# Altium footprint library Burn Wire Dev Board.PcbLib: 40 footprints (part 1 of 3)
Each footprint in its own frame and in the unit in brackets; x right, y up, seen from the top. Pads: shape width x height; smd on the part's side, far side on the other; paste and mask are expansions set on the pad; w line width, h text height; cw(c..) or ccw(c..) is an arc to the next point about the centre after c.
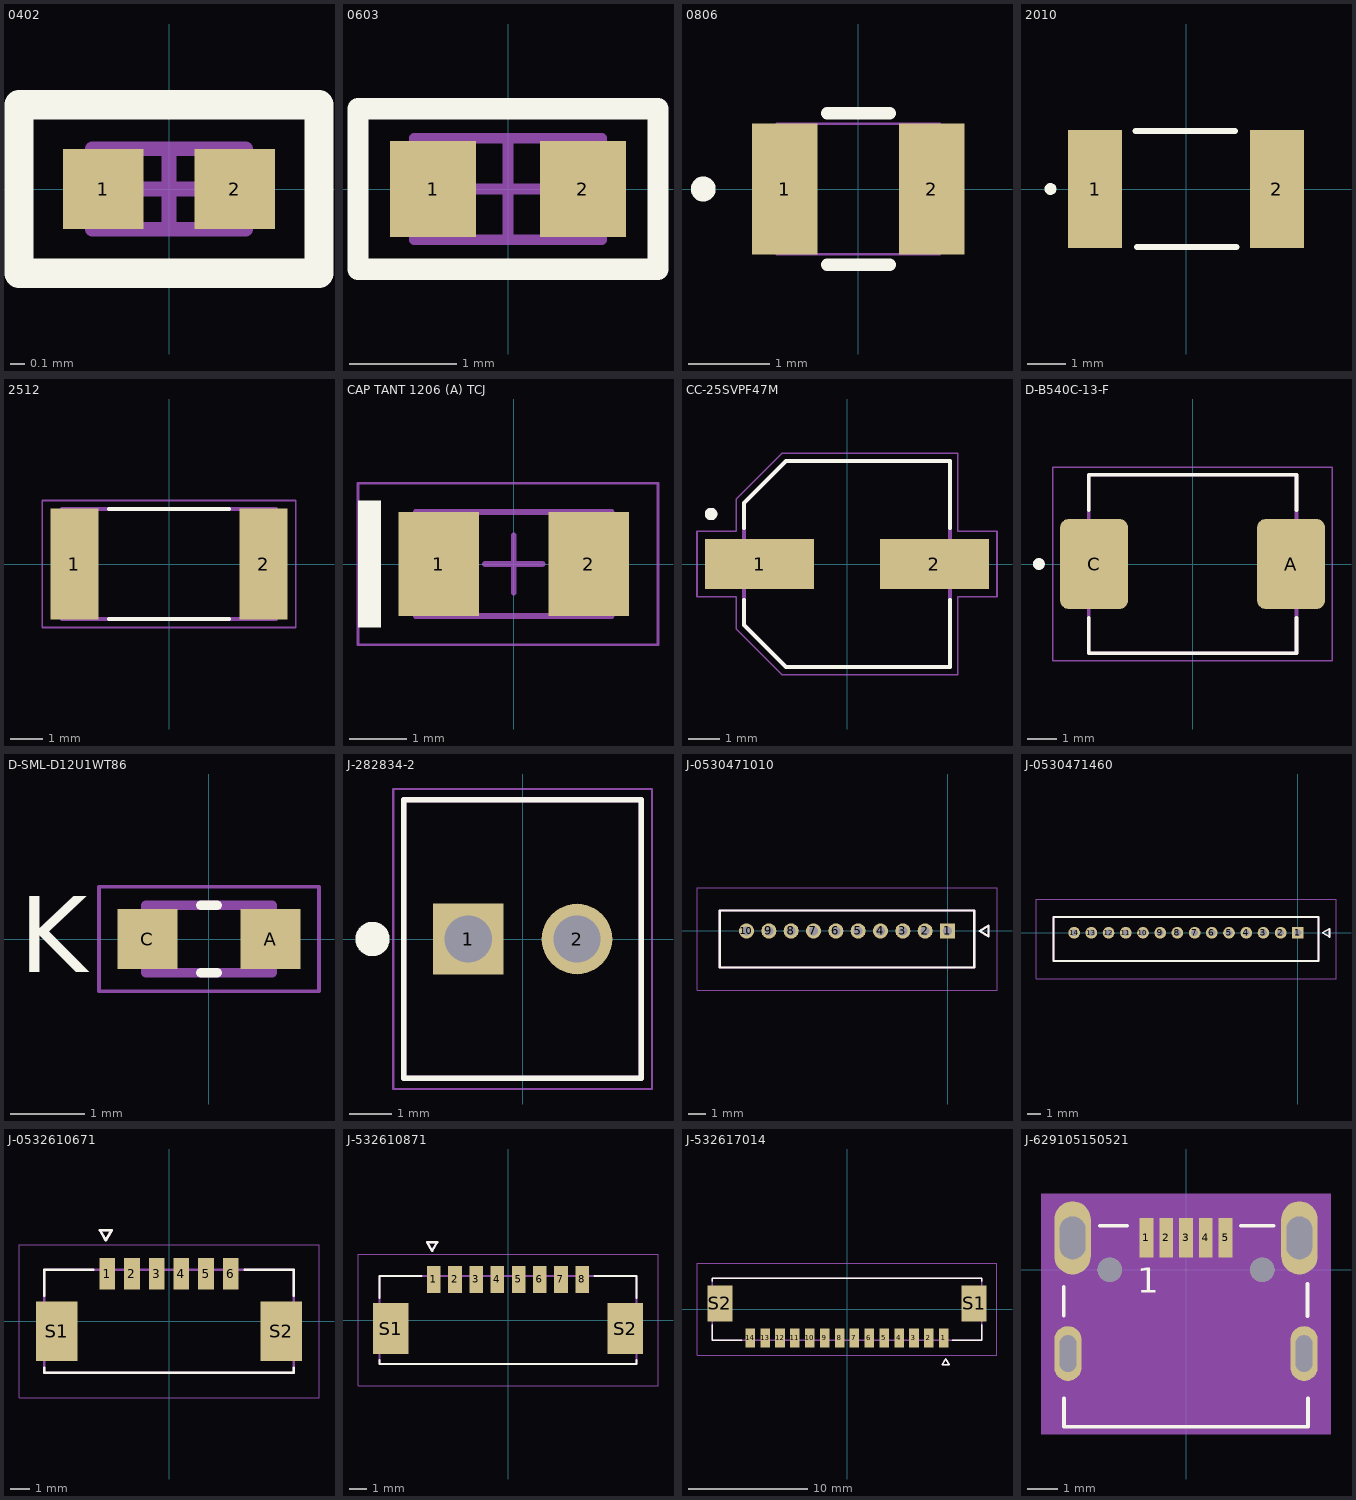
[diagram p0: the footprints below, top view; thin cyan lines are the x and y axes]

## 0402 [mm] "Chip Resistor, 2-Leads, Body 1,00x0,50mm, IPC Medium Density"
height 0.4
pads (2):
  rect 0.55x0.55 smd: 1(-0.45,0) 2(0.45,0)
Top Overlay:
  lines w0.2: -1.025,-0.575 1.025,-0.575 1.025,0.575 -1.025,0.575 -1.025,-0.575
Mechanical 13:
  lines w0.1: -0.525,-0.275 -0.525,0.275 0.525,0.275 0.525,-0.275 -0.525,-0.275
  text ".Designator" at 0,0 h1
Mechanical 15:
  lines w0.05: -1.025,-0.575 -1.025,0.575 1.025,0.575 1.025,-0.575 -1.025,-0.575
  lines w0.1: -0.275,0 0.275,0 ; 0,-0.275 0,0.275
3D body: height 0.4, standoff 0, extent -0.275,-0.275 0.275,0.275
3D body: height 0.4, standoff 0, extent -0.525,-0.275 -0.275,0.275
3D body: height 0.4, standoff 0, extent 0.275,-0.275 0.525,0.275

## 0603 [mm]
pads (2):
  rect 0.8x0.9 smd: 1(-0.7,0) 2(0.7,0)
Top Overlay:
  lines w0.2: -1.4,-0.75 -1.4,0.75 1.4,0.75 1.4,-0.75 -1.4,-0.75
Mechanical 13:
  lines w0.1: -0.875,-0.475 -0.875,0.475 0.875,0.475 0.875,-0.475 -0.875,-0.475
  text ".Designator" at 0,0 h1
Mechanical 15:
  lines w0.1: -0.475,0 0.475,0 ; 0,-0.475 0,0.475 ; -1.4,-0.75 1.4,-0.75 1.4,0.75 -1.4,0.75 -1.4,-0.75
3D body: height 1.3, standoff 0, extent -0.875,-0.475 0.875,0.475

## 0806 [mm]
pads (2):
  rect 0.8x1.6 smd paste+0 mask+0: 1(-0.9,0) 2(0.9,0)
Top Overlay:
  circle w0.152: c-1.9,0 r0.076
  lines w0.152: -0.383,-0.927 0.383,-0.927 ; -0.383,0.927 0.383,0.927
Mechanical 13:
  circle w0: c-1.002,0 r0.076
  lines w0.025: -1,-0.8 -1,0.8 ; -1,-0.8 -0.7,-0.8 -0.7,0.8 -1,0.8 ; -1,-0.8 1,-0.8 ; -1,-0.8 -1,0.8 ; -1,0.8 1,0.8 ; 1,-0.8 0.7,-0.8 0.7,0.8 1,0.8 ; 1,-0.8 1,0.8 ; 1,-0.8 1,0.8
3D body "IND_2016_TDK.step": height 0.85, standoff 0, extent -1,-0.8 1,0.8

## 2010 [mm]
pads (2):
  rect 1.4x3.05 smd paste+0 mask+0: 1(-2.35,0) 2(2.35,0)
Top Overlay:
  circle w0.152: c-3.5,0 r0.076
  lines w0.152: -1.3,1.5 1.266,1.5 ; -1.266,-1.5 1.3,-1.5
3D body "CRGP2010F22R.STEP": height 0.65, standoff 0, extent -2.5,-1.25 2.5,1.25

## 2512 [mm]
pads (2):
  rect 1.49x3.42 smd: 1(-2.914,0) 2(2.914,0)
Top Overlay:
  lines w0.127: -1.85,-1.7 1.85,-1.7 ; -1.85,1.7 1.85,1.7
Mechanical 13:
  lines w0.127: -3.3,-1.7 3.3,-1.7 3.3,1.7 -3.3,1.7 -3.3,-1.7
Mechanical 15:
  lines w0.05: -3.908,-1.958 3.908,-1.958 3.908,1.958 -3.908,1.958 -3.908,-1.958
3D body "CRA2512-FZ-R100ELF.STEP": height 0.9, standoff 0, extent -3.2,-1.6 3.2,1.6

## CAP TANT 1206 (A) TCJ [mm] "Cap Tant 2-Leads, EIA 1206, Metric 3216, Body 3.2x1.6mm"
height 1.8
pads (2):
  rect 1.4x1.8 smd: 1(-1.3,0) 2(1.3,0)
Top Overlay:
  rectangle: -2.7,-1.1 -2.3,1.1
Mechanical 13:
  lines w0.1: -1.7,-0.9 -1.7,0.9 1.7,0.9 1.7,-0.9 -1.7,-0.9
  text ".Designator" at 0,0 h1
Mechanical 15:
  lines w0.05: -2.7,-1.4 -2.7,1.4 2.5,1.4 2.5,-1.4 -2.7,-1.4
  lines w0.1: -0.5,0 0.5,0 ; 0,-0.5 0,0.5
3D body "TCJA106M016R0200E-TCJ_A-AVX-TAN.stp": height 1.72, standoff 0.01, extent -1.7,-0.84 1.7,0.84

## CC-25SVPF47M [mm]
pads (2):
  rect 3.5x1.6 smd: 1(-2.8,0) 2(2.8,0)
Top Overlay:
  circle w0.2: c-4.35,1.6 r0.1
  lines w0.127: -3.3,-1.15 -3.3,-1.95 -1.95,-3.3 3.3,-3.3 3.3,-1.15 ; -3.3,1.15 -3.3,1.95 -1.95,3.3 3.3,3.3 3.3,1.15
Mechanical 13:
  circle w0.2: c-4.35,1.6 r0.1
  lines w0.127: -3.3,-1.95 -3.3,1.95 -1.95,3.3 3.3,3.3 3.3,-3.3 -1.95,-3.3 -3.3,-1.95
Mechanical 15:
  lines w0.05: -4.8,-1.05 -4.8,1.05 -3.55,1.05 -3.55,2.075 -2.075,3.55 3.55,3.55 3.55,1.05 4.8,1.05 4.8,-1.05 3.55,-1.05 3.55,-3.55 -2.075,-3.55 -3.55,-2.075 -3.55,-1.05 -4.8,-1.05
3D body "25SVPF47M.STEP": height 5.9, standoff 0, extent -3.65,-3.3 3.65,3.3

## D-B540C-13-F [mm]
pads (2):
  rrect25% 2.33x3.07 smd: A(3.365,0) C(-3.365,0)
Top Overlay:
  circle w0.2: c-5.25,0 r0.1
  lines w0.127: -3.55,-1.849 -3.55,-3.05 3.55,-3.05 3.55,-1.849 ; -3.55,1.849 -3.55,3.05 3.55,3.05 3.55,1.849
Mechanical 13:
  circle w0.2: c-5.25,0 r0.1
  lines w0.127: -3.55,-3.05 -3.55,3.05 3.55,3.05 3.55,-3.05 -3.55,-3.05
Mechanical 15:
  lines w0.05: -4.78,-3.3 4.78,-3.3 4.78,3.3 -4.78,3.3 -4.78,-3.3
3D body "b540c-13-f.stp": height 2.25, standoff 0, extent -4.097,-2.959 3.843,2.946

## D-SML-D12U1WT86 [mm]
pads (2):
  rect 0.8x0.8 smd: A(0.825,0) C(-0.825,0)
Top Overlay:
  lines w0.127: -0.11,-0.45 0.11,-0.45 ; -0.11,0.45 0.11,0.45
  text "K" at -2.548,-0.448 h1.02
Mechanical 13:
  lines w0.127: -0.85,-0.45 0.85,-0.45 0.85,0.45 -0.85,0.45 -0.85,-0.45
Mechanical 15:
  lines w0.05: -1.475,-0.7 1.475,-0.7 1.475,0.7 -1.475,0.7 -1.475,-0.7
3D body "SML-D12U1WT86.STEP": height 0.55, standoff 0, extent -0.8,-0.4 0.8,0.4

## J-282834-2 [mm]
pads (2):
  rect 1.65x1.65 hole 1.1: 1(-1.27,0)
  round 1.65 hole 1.1: 2(1.27,0)
Top Overlay:
  circle w0.4: c-3.502,0 r0.2
  lines w0.127: -2.77,-3.25 -2.77,3.25 2.77,3.25 2.77,-3.25 -2.77,-3.25
Mechanical 13:
  lines w0.127: -2.77,-3.25 -2.77,3.25 2.77,3.25 2.77,-3.25 -2.77,-3.25
Mechanical 15:
  lines w0.05: -3.02,-3.5 -3.02,3.5 3.02,3.5 3.02,-3.5 -3.02,-3.5
3D body "282834-2.stp": height 10.03, standoff -3.37, extent -2.77,-3.25 2.77,3.25

## J-0530471010 [mm]
pads (10):
  rect 0.85x0.85 hole 0.5 mask+0.076: 1(0,0)
  round 0.85 hole 0.5 mask+0.076: 2(-1.25,0) 3(-2.5,0) 4(-3.75,0) 5(-5,0) 6(-6.25,0) 7(-7.5,0) 8(-8.75,0) 9(-10,0) 10(-11.25,0)
Top Overlay:
  lines w0.127: -12.75,-2.05 1.5,-2.05 1.5,1.15 -12.75,1.15 -12.75,-2.05 ; 1.8,0 2.3,-0.3 2.3,0.3 1.8,0
Bottom Solder:
  circle w0.501: c-1.25,0 r0.251
  circle w0.501: c-2.5,0 r0.251
  circle w0.501: c-3.75,0 r0.251
  circle w0.501: c-5,0 r0.251
  circle w0.501: c-6.25,0 r0.251
  circle w0.501: c-7.5,0 r0.251
  circle w0.501: c-8.75,0 r0.251
  circle w0.501: c-10,0 r0.251
  circle w0.501: c-11.25,0 r0.251
  region: 0.501,-0.501 -0.501,-0.501 -0.501,0.501 0.501,0.501
Mechanical 13:
  lines w0.127: -12.75,-2.05 1.5,-2.05 1.5,1.15 -12.75,1.15 -12.75,-2.05 ; 1.8,0 2.3,-0.3 2.3,0.3 1.8,0
Mechanical 15:
  lines w0.05: -14.02,-3.32 2.77,-3.32 2.77,2.42 -14.02,2.42 -14.02,-3.32
3D body "530471010--3DModel-STEP-231308.STEP": height 4.23, standoff -2.27, extent -12.713,-2.032 1.537,1.168

## J-0530471460 [mm]
pads (14):
  rect 0.85x0.85 hole 0.5 mask+0.076: 1(0,0)
  round 0.85 hole 0.5 mask+0.076: 2(-1.25,0) 3(-2.5,0) 4(-3.75,0) 5(-5,0) 6(-6.25,0) 7(-7.5,0) 8(-8.75,0) 9(-10,0) 10(-11.25,0) 11(-12.5,0) 12(-13.75,0) 13(-15,0) 14(-16.25,0)
Top Overlay:
  lines w0.127: -17.75,-2.05 -17.75,1.15 1.5,1.15 1.5,-2.05 -17.75,-2.05 ; 1.8,0 2.3,0.3 2.3,-0.3 1.8,0
Bottom Solder:
  circle w0.501: c-16.25,0 r0.251
  circle w0.501: c-15,0 r0.251
  circle w0.501: c-13.75,0 r0.251
  circle w0.501: c-12.5,0 r0.251
  circle w0.501: c-11.25,0 r0.251
  circle w0.501: c-10,0 r0.251
  circle w0.501: c-8.75,0 r0.251
  circle w0.501: c-7.5,0 r0.251
  circle w0.501: c-6.25,0 r0.251
  circle w0.501: c-5,0 r0.251
  circle w0.501: c-3.75,0 r0.251
  circle w0.501: c-2.5,0 r0.251
  circle w0.501: c-1.25,0 r0.251
  region: 0.501,-0.501 -0.501,-0.501 -0.501,0.501 0.501,0.501
Mechanical 13:
  lines w0.127: -17.75,-2.05 -17.75,1.15 1.5,1.15 1.5,-2.05 -17.75,-2.05 ; 1.8,0 2.3,0.3 2.3,-0.3 1.8,0
Mechanical 15:
  lines w0.05: -19.02,-3.32 -19.02,2.42 2.77,2.42 2.77,-3.32 -19.02,-3.32
3D body "530471460.stp": height 4.28, standoff -2.22, extent -17.78,-2.057 1.47,1.143

## J-0532610671 [mm]
pads (8):
  rect 0.8x1.6 smd mask+0: 1(-3.125,2.4) 2(-1.875,2.4) 3(-0.625,2.4) 4(0.625,2.4) 5(1.875,2.4) 6(3.125,2.4)
  rect 2.1x3 smd mask+0: S1(-5.675,-0.5) S2(5.675,-0.5)
Top Overlay:
  lines w0.127: -6.325,-2.35 -6.325,-2.6 6.325,-2.6 6.325,-2.35 ; -6.325,1.3 -6.325,2.6 -3.845,2.6 ; 3.845,2.6 6.325,2.6 6.325,1.3 ; -3.5,4.605 -3.2,4.105 -2.9,4.605 -3.5,4.605
Top Solder:
  region: 3.601,1.524 2.649,1.524 2.649,3.276 3.601,3.276
  region: 2.351,1.524 1.399,1.524 1.399,3.276 2.351,3.276
  region: 1.101,1.524 0.149,1.524 0.149,3.276 1.101,3.276
  region: -0.149,1.524 -1.101,1.524 -1.101,3.276 -0.149,3.276
  region: -1.399,1.524 -2.351,1.524 -2.351,3.276 -1.399,3.276
  region: -4.549,-2.076 -6.801,-2.076 -6.801,1.076 -4.549,1.076
  region: 6.801,-2.076 4.549,-2.076 4.549,1.076 6.801,1.076
  region: -2.649,1.524 -3.601,1.524 -3.601,3.276 -2.649,3.276
Mechanical 13:
  lines w0.127: -6.325,-2.6 -6.325,2.6 6.325,2.6 6.325,-2.6 -6.325,-2.6 ; -3.5,4.605 -3.2,4.105 -2.9,4.605 -3.5,4.605
Mechanical 15:
  lines w0.05: -7.595,-3.87 -7.595,3.87 7.595,3.87 7.595,-3.87 -7.595,-3.87
3D body "532610671--3DModel-STEP-194946.STEP": height 3.38, standoff -0.02, extent -6.325,-2.499 6.325,2.701

## J-532610871 [mm]
pads (10):
  rect 0.8x1.6 smd mask+0: 1(-4.375,2.4) 2(-3.125,2.4) 3(-1.875,2.4) 4(-0.625,2.4) 5(0.625,2.4) 6(1.875,2.4) 7(3.125,2.4) 8(4.375,2.4)
  rect 2.1x3 smd mask+0: S1(-6.925,-0.5) S2(6.925,-0.5)
Top Overlay:
  lines w0.127: -7.575,-2.35 -7.575,-2.6 7.575,-2.6 7.575,-2.35 ; -7.575,1.3 -7.575,2.6 -5.095,2.6 ; 5.095,2.6 7.575,2.6 7.575,1.3 ; -4.77,4.585 -4.47,4.085 -4.17,4.585 -4.77,4.585
Top Solder:
  region: 4.851,1.524 3.899,1.524 3.899,3.276 4.851,3.276
  region: 3.601,1.524 2.649,1.524 2.649,3.276 3.601,3.276
  region: 2.351,1.524 1.399,1.524 1.399,3.276 2.351,3.276
  region: 1.101,1.524 0.149,1.524 0.149,3.276 1.101,3.276
  region: -0.149,1.524 -1.101,1.524 -1.101,3.276 -0.149,3.276
  region: -1.399,1.524 -2.351,1.524 -2.351,3.276 -1.399,3.276
  region: -2.649,1.524 -3.601,1.524 -3.601,3.276 -2.649,3.276
  region: -5.799,-2.076 -8.051,-2.076 -8.051,1.076 -5.799,1.076
  region: 8.051,-2.076 5.799,-2.076 5.799,1.076 8.051,1.076
  region: -3.899,1.524 -4.851,1.524 -4.851,3.276 -3.899,3.276
Mechanical 13:
  lines w0.127: -7.575,-2.6 -7.575,2.6 7.575,2.6 7.575,-2.6 -7.575,-2.6 ; -4.77,4.585 -4.47,4.085 -4.17,4.585 -4.77,4.585
Mechanical 15:
  lines w0.05: -8.845,-3.87 -8.845,3.87 8.845,3.87 8.845,-3.87 -8.845,-3.87
3D body "532610871--3DModel-STEP-269445.STEP": height 3.38, standoff -0.02, extent -7.575,-2.143 7.575,3.057

## J-532617014 [mm]
pads (16):
  rect 0.8x1.6 smd mask+0: 1(8.125,-2.4) 2(6.875,-2.4) 3(5.625,-2.4) 4(4.375,-2.4) 5(3.125,-2.4) 6(1.875,-2.4) 7(0.625,-2.4) 8(-0.625,-2.4) 9(-1.875,-2.4) 10(-3.125,-2.4) 11(-4.375,-2.4) 12(-5.625,-2.4) 13(-6.875,-2.4) 14(-8.125,-2.4)
  rect 2.1x3 smd mask+0: S1(10.675,0.5) S2(-10.675,0.5)
Top Overlay:
  lines w0.127: -11.325,-1.3 -11.325,-2.6 -8.845,-2.6 ; -11.325,2.35 -11.325,2.6 11.325,2.6 11.325,2.35 ; 8.845,-2.6 11.325,-2.6 11.325,-1.3 ; 7.98,-4.652 8.58,-4.652 8.28,-4.152 7.98,-4.652
Top Solder:
  region: 8.601,-3.276 7.649,-3.276 7.649,-1.524 8.601,-1.524
  region: -9.549,-1.076 -11.801,-1.076 -11.801,2.076 -9.549,2.076
  region: 11.801,-1.076 9.549,-1.076 9.549,2.076 11.801,2.076
  region: 7.351,-3.276 6.399,-3.276 6.399,-1.524 7.351,-1.524
  region: 6.101,-3.276 5.149,-3.276 5.149,-1.524 6.101,-1.524
  region: 4.851,-3.276 3.899,-3.276 3.899,-1.524 4.851,-1.524
  region: 3.601,-3.276 2.649,-3.276 2.649,-1.524 3.601,-1.524
  region: 2.351,-3.276 1.399,-3.276 1.399,-1.524 2.351,-1.524
  region: 1.101,-3.276 0.149,-3.276 0.149,-1.524 1.101,-1.524
  region: -0.149,-3.276 -1.101,-3.276 -1.101,-1.524 -0.149,-1.524
  region: -1.399,-3.276 -2.351,-3.276 -2.351,-1.524 -1.399,-1.524
  region: -2.649,-3.276 -3.601,-3.276 -3.601,-1.524 -2.649,-1.524
  region: -3.899,-3.276 -4.851,-3.276 -4.851,-1.524 -3.899,-1.524
  region: -5.149,-3.276 -6.101,-3.276 -6.101,-1.524 -5.149,-1.524
  region: -6.399,-3.276 -7.351,-3.276 -7.351,-1.524 -6.399,-1.524
  region: -7.649,-3.276 -8.601,-3.276 -8.601,-1.524 -7.649,-1.524
Mechanical 13:
  lines w0.127: -11.325,-2.6 11.325,-2.6 11.325,2.6 -11.325,2.6 -11.325,-2.6 ; 7.98,-4.652 8.58,-4.652 8.28,-4.152 7.98,-4.652
Mechanical 15:
  lines w0.05: -12.595,-3.87 -12.595,3.87 12.595,3.87 12.595,-3.87 -12.595,-3.87
3D body "step_temp.STEP": height 3.38, standoff -0.02, extent -11.325,-2.625 11.325,2.575

## J-629105150521 [mm]
pads (11):
  rect 0.45x1.3 smd: 1(-1.3,1.05) 2(-0.65,1.05) 3(0,1.05) 4(0.65,1.05) 5(1.3,1.05)
  oval 0.9x1.8 hole 0.55 slot 1.2 at 90 deg: ""(-3.875,-2.75) ""(3.875,-2.75)
  oval 1.2x2.4 hole 0.85 slot 1.4 at 90 deg: ""(-3.725,1.05) ""(3.725,1.05)
  round 0.8 hole 0.8 unplated: ""(-2.5,0) ""(2.5,0)
Top Overlay:
  lines w0.127: -4.013,-1.499 -4.013,-0.559 ; -4,-4.216 -4,-5.15 4,-5.15 4,-4.216 ; -2.819,1.448 -1.93,1.448 ; 1.803,1.448 2.87,1.448 ; 3.988,-1.524 3.988,-0.457
  text "1" at -1.6,-0.75 h0.81
Mechanical 1:
  lines w0.127: -4.03,-3.35 -3.72,-3.35 ; -4.03,-2.15 -3.72,-2.15 ; -4,0.35 -3.45,0.35 ; -4,1.75 -3.45,1.75 ; 3.45,0.35 4,0.35 ; 3.45,1.75 4,1.75 ; 3.72,-3.35 4.03,-3.35 ; 3.72,-2.15 4.03,-2.15
Mechanical 13:
  lines w0.127: -4,-5.15 -4,1.45 4,1.45 4,-5.15
  text "1" at -1.6,-0.75 h0.81
  text "PCB edge" at -0.9,-4.68 h0.41
Mechanical 15:
  region: 4.75,-5.4 -4.75,-5.4 -4.75,2.5 4.75,2.5
3D body "629105150521.stp": height 2.88, standoff -1.58, extent -4,-5.15 4,1.453